# Altium footprint library Master_v1i3.PcbLib: 21 footprints (part 1 of 2)
Each footprint in its own frame and in the unit in brackets; x right, y up, seen from the top. Pads: shape width x height; smd on the part's side, far side on the other; paste and mask are expansions set on the pad; w line width, h text height; cw(c..) or ccw(c..) is an arc to the next point about the centre after c.
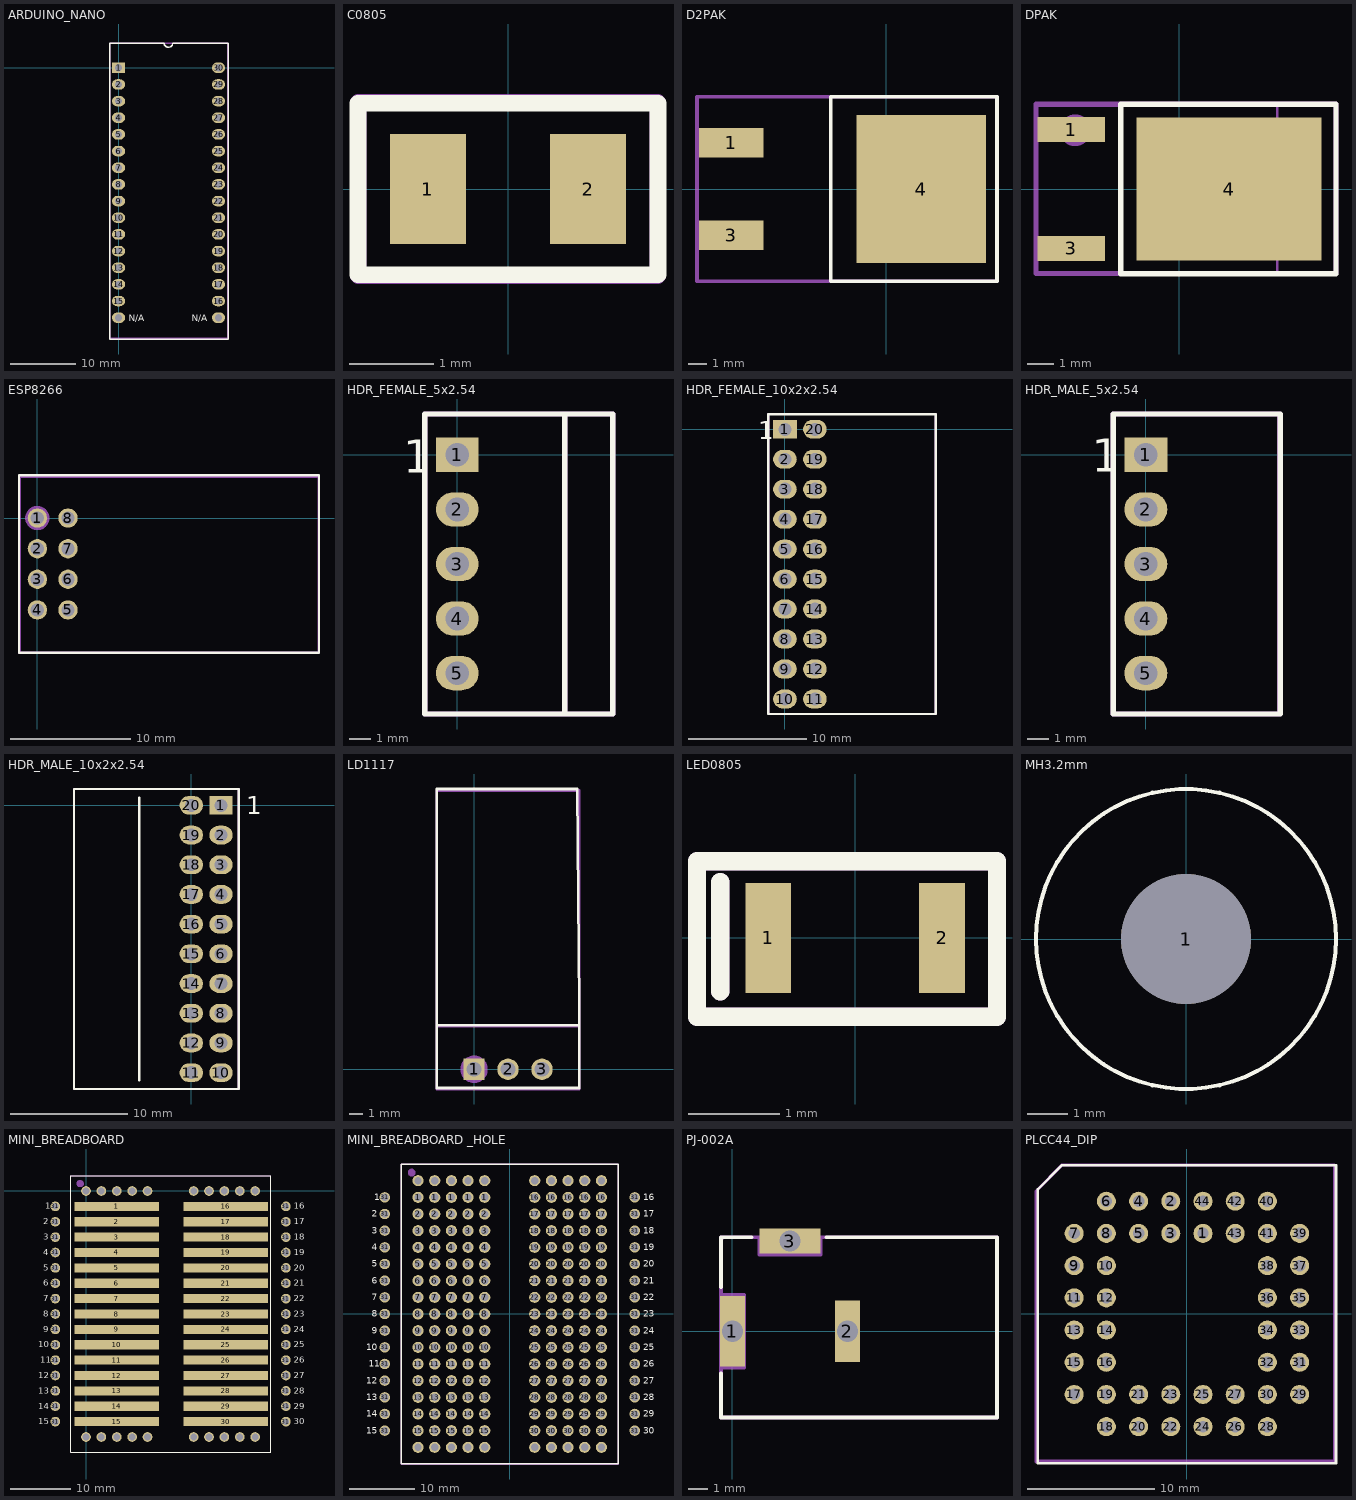
[diagram p0: the footprints below, top view; thin cyan lines are the x and y axes]

## ARDUINO_NANO [mm]
pads (32):
  rect 2x1.6 hole 1.1: 1(0,0)
  oval 2x1.6 hole 1.1: 2(0,-2.54) 3(0,-5.08) 4(0,-7.62) 5(0,-10.16) 6(0,-12.7) 7(0,-15.24) 8(0,-17.78) 9(0,-20.32) 10(0,-22.86) 11(0,-25.4) 12(0,-27.94) 13(0,-30.48) 14(0,-33.02) 15(0,-35.56) 16(15.24,-35.56) 17(15.24,-33.02) 18(15.24,-30.48) 19(15.24,-27.94) 20(15.24,-25.4) 21(15.24,-22.86) 22(15.24,-20.32) 23(15.24,-17.78) 24(15.24,-15.24) 25(15.24,-12.7) 26(15.24,-10.16) 27(15.24,-7.62) 28(15.24,-5.08) 29(15.24,-2.54) 30(15.24,0) ""(0,-38.1) ""(15.24,-38.1)
Top Overlay:
  lines w0.2: -1.372,3.759 6.96,3.759 ccw(c7.595,3.759) 8.23,3.759 16.713,3.759 ; -1.346,3.759 -1.346,-41.351 16.739,-41.351 16.739,3.759
  text "N/A" at 11.176,-38.608 h1
  text "N/A" at 1.524,-38.608 h1
Mechanical 29:
  circle w1: c0,0.051 r0.1
  lines w0.2: -1.329,-41.266 16.594,-41.266 16.671,-41.343 16.671,3.734 -1.329,3.734 -1.329,-41.266 ; -1.329,-41.266 -1.329,-41.266
  text "'.Designator'" at 9.017,-23.343 h1.52
3D body "arduino_nano.STEP": height 12.61, standoff -5.99, extent -1.329,-41.266 16.671,3.734

## C0805 [mm]
pads (2):
  rect 0.9x1.3 smd: 1(-0.95,0) 2(0.95,0)
Top Overlay:
  lines w0.2: -1.778,-1.016 -1.778,1.016 1.778,1.016 1.778,-1.016 -1.778,-1.016
Mechanical 29:
  lines w0.2: -1.775,-1.025 1.775,-1.025 1.775,1.025 -1.775,1.025 -1.775,-1.025
  text "'.Designator'" at -0.325,-0.425 h0.8
3D body "C0805.step": height 0.81, standoff 0.01, extent -1,-0.625 1,0.625

## D2PAK [mm]
pads (3):
  rect 3.5x1.6 smd: 1(-8.4,2.5) 3(-8.4,-2.5)
  rect 7x8 smd: 4(1.9,0)
Top Overlay:
  lines w0.2: -3,-5 -2.5,-5 6,-5 6,5 -3,5 -3,-5
Mechanical 29:
  circle w1: c-8.25,2.5 r0.105
  lines w0.2: -10.25,-5 -10.25,5 6,5 6,-5 -10.25,-5
  text "'.Designator'" at -5.75,-0.75 h1.52
3D body "d2pak.step": height 4.78, standoff -0.24, extent -9.916,-5.08 5.348,5.08

## DPAK [mm] "D-PAK, 3-Pads, Body 6.10x6.56mm (max), IPC Medium Density"
height 2.38
pads (3):
  rect 2.6x0.95 smd: 1(-4.15,2.28) 3(-4.15,-2.28)
  rect 7.1x5.5 smd: 4(1.9,0)
Top Overlay:
  lines w0.2: -2.25,-3.25 6,-3.25 6,3.25 -2.25,3.25 -2.25,-3.25
Mechanical 13:
  lines w0.1: -2.25,-3.2 3.75,-3.2 3.75,3.2 -2.25,3.2 -2.25,-3.2
Mechanical 29:
  circle w1: c-4,2.25 r0.105
  lines w0.2: -5.5,-3.242 6,-3.242 6,3.251 -5.5,3.251 -5.5,-3.242
  text "'.Designator'" at -1.778,-0.356 h1.52
3D body "D-PAK.step": height 2.31, standoff 0.01, extent -3.937,-3.242 5.563,3.251

## ESP8266 [mm]
pads (8):
  round 1.6 hole 1.1: 1(0,0) 2(0,-2.54) 3(0,-5.08) 4(0,-7.62) 5(2.54,-7.62) 6(2.54,-5.08) 7(2.54,-2.54) 8(2.54,0)
Top Overlay:
  lines w0.2: -1.524,-11.176 23.368,-11.176 23.368,3.556 -1.524,3.556 -1.524,-11.176
Mechanical 29:
  circle w1: c0,0 r0.508
  lines w0.2: -1.524,-11.176 23.236,-11.176 23.327,-11.085 23.327,3.415 -1.473,3.415 -1.473,-11.125 -1.524,-11.176
  text "'.Designator'" at 5.588,-4.572 h1.52
3D body "Wi07C.step": height 5.88, standoff -5.8, extent -1.473,-11.085 23.327,3.415

## HDR_FEMALE_5x2.54 [mm]
pads (5):
  rect 2x1.6 hole 1.1: 1(0,0)
  oval 2x1.6 hole 1.1: 2(0,-2.54) 3(0,-5.08) 4(0,-7.62) 5(0,-10.16)
Top Overlay:
  lines w0.254: 5.004,-12.065 5.004,1.905 ; -1.524,-12.065 -1.524,1.905 7.239,1.905 7.239,-12.065 -1.524,-12.065
  text "1" at -2.515,-0.838 h1.52
Mechanical 29:
  circle w1: c0,0.076 r0.1
  lines w0.254: 5.004,-11.938 5.004,1.905 ; -1.524,-12.065 -1.524,1.905 7.239,1.905 7.239,-12.065 -1.524,-12.065
  text "EDGE" at 6.35,-6.604 h0.8
  text "'.Designator'" at 3.175,-8.001 h1
3D body "Molex022152056.stp": height 4.71, standoff -3.34, extent -0.813,-11.354 7.061,1.245

## HDR_FEMALE_10x2x2.54 [mm] "PPPC102LJBN-RC"
pads (20):
  rect 2x1.6 hole 1.1: 1(0,0)
  oval 2x1.6 hole 1.1: 2(0,-2.54) 3(0,-5.08) 4(0,-7.62) 5(0,-10.16) 6(0,-12.7) 7(0,-15.24) 8(0,-17.78) 9(0,-20.32) 10(0,-22.86) 11(2.54,-22.86) 12(2.54,-20.32) 13(2.54,-17.78) 14(2.54,-15.24) 15(2.54,-12.7) 16(2.54,-10.16) 17(2.54,-7.62) 18(2.54,-5.08) 19(2.54,-2.54) 20(2.54,0)
Top Overlay:
  lines w0.2: 0.635,1.27 12.776,1.27 12.776,-24.13 -1.422,-24.13 -1.422,1.27 1.905,1.27
  text "1" at -2.261,-0.838 h1.52
Mechanical 29:
  circle w1: c-0.076,-0.025 r0.025
  lines w0.2: -1.422,1.27 -1.422,-24.079 -1.372,-24.13 12.776,-24.13 12.776,1.295 -1.397,1.295
  text "'.Designator'" at 2.032,-17.755 h1.52
3D body "C102LJBN-RC.STEP": height 5.09, standoff -3.14, extent -0.076,-24.431 12.764,1.469

## HDR_MALE_5x2.54 [mm]
pads (5):
  rect 2x1.6 hole 1.1: 1(0,0)
  oval 2x1.6 hole 1.1: 2(0,-2.54) 3(0,-5.08) 4(0,-7.62) 5(0,-10.16)
Top Overlay:
  lines w0.254: -1.524,-12.065 -1.524,1.905 6.25,1.905 6.25,-12.065 -1.524,-12.065
  text "1" at -2.515,-0.787 h1.52
Mechanical 29:
  circle w1: c0,0.076 r0.1
  lines w0.254: -1.524,-12.065 -1.524,1.905 6.223,1.905 6.223,-12.065 -1.524,-12.065
  text "'.Designator'" at 2.921,-9.398 h1.52
3D body "Molex022053051.stp": height 6.36, standoff -3.57, extent -0.34,-11.354 12.588,1.194

## HDR_MALE_10x2x2.54 [mm] "PRPC010DBAN-M71RC"
pads (20):
  rect 2x1.6 hole 1.1: 1(2.54,0)
  oval 2x1.6 hole 1.1: 2(2.54,-2.54) 3(2.54,-5.08) 4(2.54,-7.62) 5(2.54,-10.16) 6(2.54,-12.7) 7(2.54,-15.24) 8(2.54,-17.78) 9(2.54,-20.32) 10(2.54,-22.86) 11(0,-22.86) 12(0,-20.32) 13(0,-17.78) 14(0,-15.24) 15(0,-12.7) 16(0,-10.16) 17(0,-7.62) 18(0,-5.08) 19(0,-2.54) 20(0,0)
Top Overlay:
  lines w0.2: -4.445,-23.495 -4.445,0.635 ; -10.033,-24.257 -10.033,1.397 4.064,1.397 4.064,-24.257 -10.033,-24.257
  text "1" at 4.699,-0.762 h1.52
Mechanical 29:
  circle w1: c-0.076,-0.025 r0.025
  lines w0.2: -10.033,-24.257 2.667,-24.257 4.064,-24.257 4.064,1.397 -10.033,1.397 -10.033,-24.257
  text "'.Designator'" at -6.477,-13.589 h1.52
3D body "C010DBAN-M71RC.STEP": height 5.01, standoff -3.04, extent -9.926,-24.105 2.794,1.295

## LD1117 [mm]
pads (3):
  rect 1.6x1.6 hole 1.1: 1(0,0)
  round 1.6 hole 1.1: 2(2.54,0) 3(5.08,0)
Top Overlay:
  lines w0.2: -2.794,3.302 -2.794,4.826 -2.794,20.955 7.725,20.955 7.874,4.826 7.874,3.302 ; -2.794,3.302 7.874,3.302 ; -2.794,3.302 -2.794,-1.397 7.874,-1.397 7.874,3.302
Mechanical 29:
  circle w1: c0,0 r0.524
  lines w0.2: -2.795,3.225 -2.795,-1.474 7.875,-1.474 7.875,3.226 ; 7.875,3.226 -2.795,3.226 -2.795,20.838 7.875,20.838 7.875,16.435 7.875,7.629 7.875,3.226
  text "'.Designator'" at 1.397,0.127 h1.52
3D body: height 28.21, standoff 23.51, extent -5.994,3.226 -5.994,3.226
3D body "TO220-1.step": height 4.5, standoff -3.5, extent -2.66,-0.127 7.74,20.973

## LED0805 [mm]
pads (2):
  rect 0.5x1.2 smd: 1(-0.95,0) 2(0.95,0)
Top Overlay:
  lines w0.2: -1.473,-0.584 -1.473,0.61 ; -1.727,-0.864 -1.727,0.838 1.549,0.838 1.549,-0.864 -1.727,-0.864
Mechanical 29:
  lines w0.2: -1.473,-0.584 -1.473,0.61 ; -1.727,-0.864 -1.727,0.838 1.549,0.838 1.549,-0.864 -1.727,-0.864
  text "'.Designator'" at -1.041,-0.381 h0.7
3D body "led_0805.step": height 1.1, standoff 0, extent -1.01,-0.625 1.01,0.625

## MH3.2mm [mm] "MHNP 3.2mm"
pads (1):
  round 3.2 hole 3.2 unplated: 1(0,0)
Top Overlay:
  circle w0.1: c0,0 r3.7

## MINI_BREADBOARD [mm]
pads (80):
  rect 14x1.5 smd: 1(5.08,-2.54) 2(5.08,-5.08) 3(5.08,-7.62) 4(5.08,-10.16) 5(5.08,-12.7) 6(5.08,-15.24) 7(5.08,-17.78) 8(5.08,-20.32) 9(5.08,-22.86) 10(5.08,-25.4) 11(5.08,-27.94) 12(5.08,-30.48) 13(5.08,-33.02) 14(5.08,-35.56) 15(5.08,-38.1) 16(23.08,-2.54) 17(23.08,-5.08) 18(23.08,-7.62) 19(23.08,-10.16) 20(23.08,-12.7) 21(23.08,-15.24) 22(23.08,-17.78) 23(23.08,-20.32) 24(23.08,-22.86) 25(23.08,-25.4) 26(23.08,-27.94) 27(23.08,-30.48) 28(23.08,-33.02) 29(23.08,-35.56) 30(23.08,-38.1)
  round 1.6 hole 1.1: 31(-5.08,-38.1) 31(-5.08,-35.56) 31(-5.08,-33.02) 31(-5.08,-30.48) 31(-5.08,-27.94) 31(-5.08,-25.4) 31(-5.08,-22.86) 31(-5.08,-20.32) 31(-5.08,-17.78) 31(-5.08,-15.24) 31(-5.08,-12.7) 31(-5.08,-10.16) 31(-5.08,-7.62) 31(-5.08,-5.08) 31(-5.08,-2.54) 31(33.02,-38.1) 31(33.02,-35.56) 31(33.02,-33.02) 31(33.02,-30.48) 31(33.02,-27.94) 31(33.02,-25.4) 31(33.02,-22.86) 31(33.02,-20.32) 31(33.02,-17.78) 31(33.02,-15.24) 31(33.02,-12.7) 31(33.02,-10.16) 31(33.02,-7.62) 31(33.02,-5.08) 31(33.02,-2.54) ""(0,-40.64) ""(0,0) ""(2.54,-40.64) ""(2.54,0) ""(5.08,-40.64) ""(5.08,0) ""(7.62,-40.64) ""(7.62,0) ""(10.16,-40.64) ""(10.16,0) ""(17.78,-40.64) ""(17.78,0) ""(20.32,-40.64) ""(20.32,0) ""(22.86,-40.64) ""(22.86,0) ""(25.4,-40.64) ""(25.4,0) ""(27.94,-40.64) ""(27.94,0)
Top Overlay:
  lines w0.2: -2.54,-43.18 -2.54,2.54 30.48,2.54 30.48,-43.18 -2.54,-43.18
  text "1" at -6.708,-2.972 h1
  text "2" at -7.041,-5.514 h1
  text "3" at -7.041,-8.055 h1
  text "4" at -7.041,-10.597 h1
  text "5" at -7.041,-13.139 h1
  text "6" at -7.041,-15.681 h1
  text "12" at -7.874,-30.932 h1
  text "11" at -7.541,-28.39 h1
  text "10" at -7.874,-25.848 h1
  text "9" at -7.041,-23.306 h1
  text "8" at -7.041,-20.765 h1
  text "7" at -7.041,-18.223 h1
  text "15" at -7.874,-38.557 h1
  text "14" at -7.874,-36.015 h1
  text "13" at -7.874,-33.474 h1
  text "28" at 34.29,-33.474 h1
  text "29" at 34.29,-36.015 h1
  text "30" at 34.29,-38.557 h1
  text "22" at 34.29,-18.223 h1
  text "23" at 34.29,-20.765 h1
  text "24" at 34.29,-23.306 h1
  text "25" at 34.29,-25.848 h1
  text "26" at 34.29,-28.39 h1
  text "27" at 34.29,-30.932 h1
  text "21" at 34.29,-15.681 h1
  text "20" at 34.29,-13.139 h1
  text "19" at 34.29,-10.597 h1
  text "18" at 34.29,-8.055 h1
  text "17" at 34.29,-5.514 h1
  text "16" at 34.29,-2.972 h1
Mechanical 29:
  circle w1: c-0.965,1.219 r0.1
  lines w0.2: -2.54,-43.18 30.48,-43.18 30.48,2.54 -2.54,2.54 -2.54,-43.18
  text "'.Designator'" at 14.986,-26.162 h1.52
3D body "Minibreadboard-170-Holes.step": height 9.54, standoff 0.01, extent -2.54,-43.18 30.48,2.54

## MINI_BREADBOARD _HOLE [mm]
pads (200):
  round 1.7 hole 1.1: 1(-13.97,17.78) 1(-11.43,17.78) 1(-8.89,17.78) 1(-6.35,17.78) 1(-3.81,17.78) 2(-13.97,15.24) 2(-11.43,15.24) 2(-8.89,15.24) 2(-6.35,15.24) 2(-3.81,15.24) 3(-13.97,12.7) 3(-11.43,12.7) 3(-8.89,12.7) 3(-6.35,12.7) 3(-3.81,12.7) 4(-13.97,10.16) 4(-11.43,10.16) 4(-8.89,10.16) 4(-6.35,10.16) 4(-3.81,10.16) 5(-13.97,7.62) 5(-11.43,7.62) 5(-8.89,7.62) 5(-6.35,7.62) 5(-3.81,7.62) 6(-13.97,5.08) 6(-11.43,5.08) 6(-8.89,5.08) 6(-6.35,5.08) 6(-3.81,5.08) 7(-13.97,2.54) 7(-11.43,2.54) 7(-8.89,2.54) 7(-6.35,2.54) 7(-3.81,2.54) 8(-13.97,0) 8(-11.43,0) 8(-8.89,0) 8(-6.35,0) 8(-3.81,0) 9(-13.97,-2.54) 9(-11.43,-2.54) 9(-8.89,-2.54) 9(-6.35,-2.54) 9(-3.81,-2.54) 10(-13.97,-5.08) 10(-11.43,-5.08) 10(-8.89,-5.08) 10(-6.35,-5.08) 10(-3.81,-5.08) 11(-13.97,-7.62) 11(-11.43,-7.62) 11(-8.89,-7.62) 11(-6.35,-7.62) 11(-3.81,-7.62) 12(-13.97,-10.16) 12(-11.43,-10.16) 12(-8.89,-10.16) 12(-6.35,-10.16) 12(-3.81,-10.16) 13(-13.97,-12.7) 13(-11.43,-12.7) 13(-8.89,-12.7) 13(-6.35,-12.7) 13(-3.81,-12.7) 14(-13.97,-15.24) 14(-11.43,-15.24) 14(-8.89,-15.24) 14(-6.35,-15.24) 14(-3.81,-15.24) 15(-13.97,-17.78) 15(-11.43,-17.78) 15(-8.89,-17.78) 15(-6.35,-17.78) 15(-3.81,-17.78) 16(3.81,17.78) 16(6.35,17.78) 16(8.89,17.78) 16(11.43,17.78) 16(13.97,17.78) 17(3.81,15.24) 17(6.35,15.24) 17(8.89,15.24) 17(11.43,15.24) 17(13.97,15.24) 18(3.81,12.7) 18(6.35,12.7) 18(8.89,12.7) 18(11.43,12.7) 18(13.97,12.7) 19(3.81,10.16) 19(6.35,10.16) 19(8.89,10.16) 19(11.43,10.16) 19(13.97,10.16) 20(3.81,7.62) 20(6.35,7.62) 20(8.89,7.62) 20(11.43,7.62) 20(13.97,7.62) 21(3.81,5.08) 21(6.35,5.08) 21(8.89,5.08) 21(11.43,5.08) 21(13.97,5.08) 22(3.81,2.54) 22(6.35,2.54) 22(8.89,2.54) 22(11.43,2.54) 22(13.97,2.54) 23(3.81,0) 23(6.35,0) 23(8.89,0) 23(11.43,0) 23(13.97,0) 24(3.81,-2.54) 24(6.35,-2.54) 24(8.89,-2.54) 24(11.43,-2.54) 24(13.97,-2.54) 25(3.81,-5.08) 25(6.35,-5.08) 25(8.89,-5.08) 25(11.43,-5.08) 25(13.97,-5.08) 26(3.81,-7.62) 26(6.35,-7.62) 26(8.89,-7.62) 26(11.43,-7.62) 26(13.97,-7.62) 27(3.81,-10.16) 27(6.35,-10.16) 27(8.89,-10.16) 27(11.43,-10.16) 27(13.97,-10.16) 28(3.81,-12.7) 28(6.35,-12.7) 28(8.89,-12.7) 28(11.43,-12.7) 28(13.97,-12.7) 29(3.81,-15.24) 29(6.35,-15.24) 29(8.89,-15.24) 29(11.43,-15.24) 29(13.97,-15.24) 30(3.81,-17.78) 30(6.35,-17.78) 30(8.89,-17.78) 30(11.43,-17.78) 30(13.97,-17.78) ""(-13.97,-20.32) ""(-13.97,20.32) ""(-11.43,-20.32) ""(-11.43,20.32) ""(-8.89,-20.32) ""(-8.89,20.32) ""(-6.35,-20.32) ""(-6.35,20.32) ""(-3.81,-20.32) ""(-3.81,20.32) ""(3.81,-20.32) ""(3.81,20.32) ""(6.35,-20.32) ""(6.35,20.32) ""(8.89,-20.32) ""(8.89,20.32) ""(11.43,-20.32) ""(11.43,20.32) ""(13.97,-20.32) ""(13.97,20.32)
  round 1.6 hole 1.1: 31(-19.05,-17.78) 31(-19.05,-15.24) 31(-19.05,-12.7) 31(-19.05,-10.16) 31(-19.05,-7.62) 31(-19.05,-5.08) 31(-19.05,-2.54) 31(-19.05,0) 31(-19.05,2.54) 31(-19.05,5.08) 31(-19.05,7.62) 31(-19.05,10.16) 31(-19.05,12.7) 31(-19.05,15.24) 31(-19.05,17.78) 31(19.05,-17.78) 31(19.05,-15.24) 31(19.05,-12.7) 31(19.05,-10.16) 31(19.05,-7.62) 31(19.05,-5.08) 31(19.05,-2.54) 31(19.05,0) 31(19.05,2.54) 31(19.05,5.08) 31(19.05,7.62) 31(19.05,10.16) 31(19.05,12.7) 31(19.05,15.24) 31(19.05,17.78)
Top Overlay:
  lines w0.2: -16.51,-22.86 -16.51,22.86 16.51,22.86 16.51,-22.86 -16.51,-22.86
  text "1" at -20.678,17.348 h1
  text "2" at -21.011,14.806 h1
  text "3" at -21.011,12.265 h1
  text "4" at -21.011,9.723 h1
  text "5" at -21.011,7.181 h1
  text "6" at -21.011,4.639 h1
  text "12" at -21.844,-10.612 h1
  text "11" at -21.511,-8.07 h1
  text "10" at -21.844,-5.528 h1
  text "9" at -21.011,-2.986 h1
  text "8" at -21.011,-0.445 h1
  text "7" at -21.011,2.097 h1
  text "15" at -21.844,-18.237 h1
  text "14" at -21.844,-15.695 h1
  text "13" at -21.844,-13.154 h1
  text "28" at 20.32,-13.154 h1
  text "29" at 20.32,-15.695 h1
  text "30" at 20.32,-18.237 h1
  text "22" at 20.32,2.097 h1
  text "23" at 20.32,-0.445 h1
  text "24" at 20.32,-2.986 h1
  text "25" at 20.32,-5.528 h1
  text "26" at 20.32,-8.07 h1
  text "27" at 20.32,-10.612 h1
  text "21" at 20.32,4.639 h1
  text "20" at 20.32,7.181 h1
  text "19" at 20.32,9.723 h1
  text "18" at 20.32,12.265 h1
  text "17" at 20.32,14.806 h1
  text "16" at 20.32,17.348 h1
Mechanical 29:
  circle w1: c-14.935,21.539 r0.1
  lines w0.2: -16.51,-22.86 16.51,-22.86 16.51,22.86 -16.51,22.86 -16.51,-22.86
  text "'.Designator'" at 1.016,-5.842 h1.52
3D body "Minibreadboard-170-Holes.step": height 9.54, standoff 0.01, extent -16.51,-22.86 16.51,22.86

## PJ-002A [mm] "CONN PWR JACK 2X5.5MM SOLDER"
pads (3):
  rect 1.3x3.7 hole 1.1 square: 1(0,0)
  rect 1.3x3.2 hole 1.1 square: 2(6,0)
  rect 3.2x1.3 hole 1.1 square: 3(3,4.7)
Top Overlay:
  lines w0.2: -0.6,-2.2 -0.6,-4.5 13.8,-4.5 13.8,4.9 4.9,4.9 ; -0.6,2.3 -0.6,4.9 1,4.9
Mechanical 29:
  lines w0.2: -0.6,4.9 13.8,4.9 13.8,-4.5 -0.6,-4.5 -0.6,4.8 -0.5,4.9 ; -0.5,-1.9 0.6,-1.9 0.6,1.9 -0.5,1.9 ; 1.4,4.9 1.4,4 4.6,4 4.6,4.9
  text "'.Designator'" at 3.6,-0.7 h1.52
3D body "PJ-002AH.STEP": height 11.05, standoff -3.45, extent -0.6,-4.5 13.8,4.9

## PLCC44_DIP [mm]
pads (44):
  round 1.5 hole 0.9: 1(1.27,6.35) 2(-1.27,8.89) 3(-1.27,6.35) 4(-3.81,8.89) 5(-3.81,6.35) 6(-6.35,8.89) 7(-8.89,6.35) 8(-6.35,6.35) 9(-8.89,3.81) 10(-6.35,3.81) 11(-8.89,1.27) 12(-6.35,1.27) 13(-8.89,-1.27) 14(-6.35,-1.27) 15(-8.89,-3.81) 16(-6.35,-3.81) 17(-8.89,-6.35) 18(-6.35,-8.89) 19(-6.35,-6.35) 20(-3.81,-8.89) 21(-3.81,-6.35) 22(-1.27,-8.89) 23(-1.27,-6.35) 24(1.27,-8.89) 25(1.27,-6.35) 26(3.81,-8.89) 27(3.81,-6.35) 28(6.35,-8.89) 29(8.89,-6.35) 30(6.35,-6.35) 31(8.89,-3.81) 32(6.35,-3.81) 33(8.89,-1.27) 34(6.35,-1.27) 35(8.89,1.27) 36(6.35,1.27) 37(8.89,3.81) 38(6.35,3.81) 39(8.89,6.35) 40(6.35,8.89) 41(6.35,6.35) 42(3.81,8.89) 43(3.81,6.35) 44(1.27,8.89)
Top Overlay:
  lines w0.2: -11.76,-11.76 -11.76,9.83 -9.855,11.735 11.76,11.735 11.76,-11.76 -11.76,-11.76
Mechanical 29:
  lines w0.254: -11.9,-11.65 -11.875,-11.625 11.65,-11.625 11.65,11.75 -9.825,11.75 -11.9,9.675 -11.9,-11.65
  text "'.Designator'" at -1.175,-0.875 h1.52
3D body "plc44dip.stp": height 8.56, standoff -3.19, extent -11.59,-11.59 11.59,11.59
3D body: height 9, standoff 4, extent -3.75,-3.75 3.75,3.75
3D body "PLCC44.step": height 9, standoff 4.4, extent -8.65,-8.65 8.65,8.65